# Altium footprint library RDM_ALT_PCB.PcbLib: 129 footprints (part 6 of 9)
Each footprint in its own frame and in the unit in brackets; x right, y up, seen from the top. Pads: shape width x height; smd on the part's side, far side on the other; paste and mask are expansions set on the pad; w line width, h text height; cw(c..) or ccw(c..) is an arc to the next point about the centre after c.
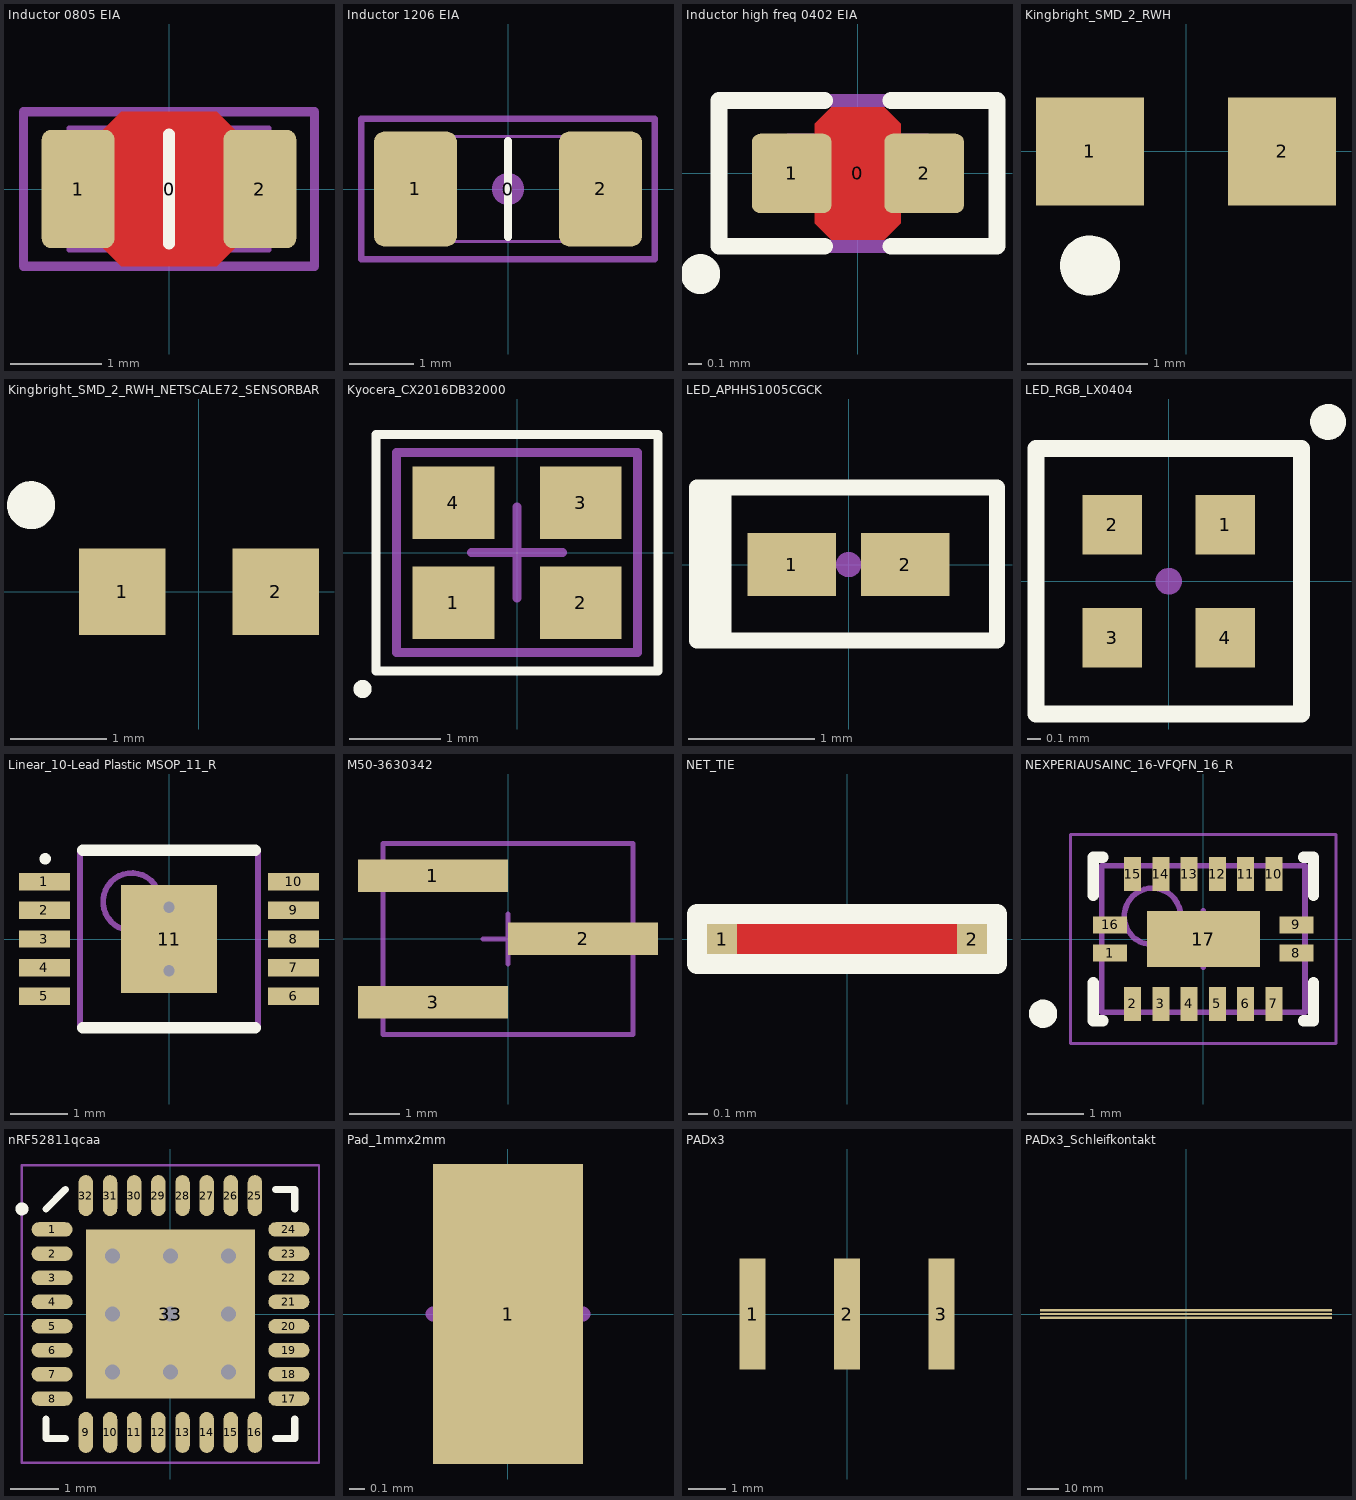
[diagram p5: the footprints below, top view; thin cyan lines are the x and y axes]

## Inductor 0805 EIA [mm]
pads (3):
  round 0.254 on Mech15: 0(0,0)
  rrect25% 0.8x1.3 smd: 1(-1,0) 2(1,0)
Top Layer:
  pour cut-out: -0.725,0.65 -0.525,0.85 0.525,0.85 0.725,0.65 0.725,-0.65 0.525,-0.85 -0.525,-0.85 -0.725,-0.65
Top Overlay:
  lines w0.127: 0,-0.6 0,0.6
Mechanical 13:
  lines w0.05: 0.6,-0.674 -0.6,-0.674 ; -0.6,-0.675 -0.6,0.675 -1.1,0.675 -1.1,-0.675 -0.6,-0.675 ; -0.6,-0.674 0.6,-0.674 ; 0.6,-0.675 0.6,0.675 ; 0.6,-0.675 1.1,-0.675 1.1,0.675 0.6,0.675 ; 0.6,0.674 -0.6,0.674 0.6,0.674
Mechanical 15:
  lines w0.1: -1.6,-0.85 1.6,-0.85 1.6,0.85 -1.6,0.85 -1.6,-0.85
3D body "RES 0805 (2012 metric).STEP": height 0.69, standoff -0.01, extent -1.1,-0.675 1.1,0.675

## Inductor 1206 EIA [mm]
pads (3):
  round 0.508 on Mech15: 0(0,0)
  rrect25% 1.3x1.8 smd: 1(-1.45,0) 2(1.45,0)
Top Overlay:
  lines w0.127: 0,-0.75 0,0.75
Mechanical 13:
  lines w0.05: 1.025,-0.824 -1.025,-0.824 1.025,-0.824 ; -1.625,-0.825 -1.025,-0.825 -1.025,0.825 -1.625,0.825 -1.625,-0.825 ; -1.025,0.824 1.025,0.824 -1.025,0.824 ; 1.025,-0.825 1.025,0.825 1.625,0.825 1.625,-0.825 1.025,-0.825
Mechanical 15:
  lines w0.1: -2.3,-1.1 -2.3,1.1 2.3,1.1 2.3,-1.1 -2.3,-1.1
3D body "RES 1206 (3216 metric).STEP": height 0.69, standoff -0.01, extent -1.625,-0.825 1.625,0.825

## Inductor high freq 0402 EIA [mm]
pads (3):
  round 0.2 on Mech15: 0(0,0)
  rrect20% 0.6x0.6 smd: 1(-0.5,0) 2(0.5,0)
Top Layer:
  pour cut-out: -0.325,0.375 -0.2,0.5 0.2,0.5 0.325,0.375 0.325,-0.375 0.2,-0.5 -0.2,-0.5 -0.325,-0.375
Top Overlay:
  circle w0.25: c-1.19,-0.76 r0.025
  lines w0.127: -0.25,-0.55 -1.05,-0.55 -1.05,0.55 -0.25,0.55 ; 0.25,-0.55 1.05,-0.55 1.05,0.55 0.25,0.55
Mechanical 13:
  lines w0.05: 0.225,-0.274 -0.225,-0.274 0.225,-0.274 ; -0.525,-0.275 -0.525,0.275 -0.225,0.275 -0.225,-0.275 -0.525,-0.275 ; -0.225,0.274 0.225,0.274 -0.225,0.274 ; 0.225,-0.275 0.525,-0.275 0.525,0.275 0.225,0.275 0.225,-0.275
Mechanical 15:
  lines w0.1: -1.05,-0.55 -1.05,0.55 1.05,0.55 1.05,-0.55 -1.05,-0.55
3D body "RES 0402 (1005 metric).STEP": height 0.4, standoff 0, extent -0.525,-0.275 0.525,0.275

## Kingbright_SMD_2_RWH [mm] "Kingbright_SMD_2_RWH"
height 0.6
pads (2):
  rect 0.9x0.9 smd: 1(-0.8,0) 2(0.8,0)
Top Overlay:
  circle w0.25: c-0.8,-0.95 r0.125
3D body "APA1606.STEP": height 0.6, standoff 0, extent -0.801,-0.301 0.8,0.9

## Kingbright_SMD_2_RWH_NETSCALE72_SENSORBAR [mm] "Kingbright_SMD_2_RWH"
height 0.6
pads (2):
  rect 0.9x0.9 smd: 1(-0.8,0) 2(0.8,0)
Top Overlay:
  circle w0.25: c-1.75,0.9 r0.125
3D body "APA1606.STEP": height 0.6, standoff 0, extent -0.801,-0.301 0.8,0.9

## Kyocera_CX2016DB32000 [mm] "CRYSTAL 32.0000MHZ 8PF SMD"
pads (4):
  rect 0.9x0.8 smd: 1(-0.7,-0.55) 2(0.7,-0.55) 3(0.7,0.55) 4(-0.7,0.55)
Top Overlay:
  circle w0.1: c-1.7,-1.5 r0.05
  lines w0.1: -1.55,-1.3 1.55,-1.3 1.55,1.3 -1.55,1.3 -1.55,-1.3
Mechanical 13:
  lines w0.1: -1.325,-1.1 1.325,-1.1 1.325,1.1 -1.325,1.1 -1.325,-1.1
Mechanical 15:
  lines w0.05: -1.55,-1.3 1.55,-1.3 1.55,1.3 -1.55,1.3 -1.55,-1.3
  lines w0.1: -0.5,0 0.5,0 ; 0,-0.5 0,0.5
3D body: height 0.01, standoff -0.05, extent -1.05,-0.85 -0.475,-0.325
3D body: height 0.01, standoff -0.05, extent 0.475,-0.85 1.05,-0.317
3D body: height 0.01, standoff -0.05, extent 0.475,0.325 1.05,0.85
3D body: height 0.01, standoff -0.05, extent -1.05,0.325 -0.475,0.85
3D body: height 0.45, standoff 0, extent -1.15,-0.95 1.15,0.95
3D body: height 0.6, standoff -0.6, extent 0.375,-1.4 0.375,-1.4

## LED_APHHS1005CGCK [mm] "LED_CHIP_0402"
height 0.6
pads (2):
  rect 0.7x0.5 smd: 1(-0.45,0) 2(0.45,0)
Top Overlay:
  rectangle: -1.2,-0.6 -0.925,0.6
  lines w0.127: -1.2,-0.6 -1.2,0.61 1.175,0.61 1.175,-0.6 -1.2,-0.6
Mechanical 15:
  circle w0.1: c0,0 r0.05
  lines w0.1: -1.125,-0.6 -1.125,0.6 1.175,0.6 1.175,-0.6 -1.125,-0.6
3D body "User Library-LED_1006_G.STEP": height 0.2, standoff 0, extent -0.5,-0.3 0.5,0.3

## LED_RGB_LX0404 [mm] "LED RGB CLEAR SMD"
height 0.25
pads (4):
  rect 0.45x0.45 smd: 1(0.425,0.425) 2(-0.425,0.425) 3(-0.425,-0.425) 4(0.425,-0.425)
Top Overlay:
  circle w0.15: c1.2,1.2 r0.06
  lines w0.127: -1,-1 1,-1 1,1 -1,1 -1,-1
Mechanical 15:
  circle w0.1: c0,0 r0.05
  lines w0.1: -1,-1 -1,1 1,1 1,-1 -1,-1
3D body: height 0.26, standoff 0, extent -0.128,-0.333 0.128,0.333
3D body: height 0.25, standoff 0, extent -0.8,-0.8 0.8,0.8
3D body: height 0.26, standoff 0, extent 0.297,-0.333 0.553,0.333
3D body: height 0.26, standoff 0, extent -0.553,-0.333 -0.297,0.333

## Linear_10-Lead Plastic MSOP_11_R [mm] "Linear_10-Lead Plastic MSOP_11_R"
height 1.1
pads (11):
  rect 0.889x0.305 smd mask+0.082: 1(-2.171,1) 2(-2.171,0.5) 3(-2.171,0) 4(-2.171,-0.5) 5(-2.171,-1) 6(2.171,-1) 7(2.171,-0.5) 8(2.171,0) 9(2.171,0.5) 10(2.171,1)
  rect 1.68x1.88 smd mask+0.082: 11(0,0)
via 0,-0.55 diameter 0.5 hole 0.2
via 0,0.55 diameter 0.5 hole 0.2
Top Overlay:
  circle w0.2: c-2.159,1.397 r0
  lines w0.2: -1.5,-1.55 1.5,-1.55 ; -1.5,1.55 1.5,1.55
Mechanical 13:
  circle w0.1: c-0.65,0.65 r0.5
  lines w0.1: -1.55,-1.55 1.55,-1.55 1.55,1.55 -1.55,1.55 -1.55,-1.55
3D body: height 1.1, standoff 0.05, extent -1.55,-1.55 1.55,1.55

## M50-3630342 [mm] "M50-3630342"
height 4.5
pads (3):
  rect 3x0.65 smd: 1(-1.5,1.27) 2(1.5,0) 3(-1.5,-1.27)
Mechanical 13:
  lines w0.1: -2.5,-1.906 -2.5,1.906 2.5,1.906 2.5,-1.906 -2.5,-1.906
Mechanical 15:
  lines w0.1: -0.5,0 0.5,0 ; 0,-0.5 0,0.5
3D body "M50-3630342.STEP": height 4.5, standoff 0, extent -2.5,-1.906 2.5,1.906

## NET_TIE [mil] "Allows to short two different types of nets"
pads (2):
  rect 6x6 smd: 1(-25,0) 2(25,0)
Top Layer:
  lines w6: -25,0 25,0
Top Overlay:
  lines w4: -30,-5 -30,5 30,5 30,-5 -30,-5

## NEXPERIAUSAINC_16-VFQFN_16_R [mm]
pads (17):
  rect 0.6x0.3 smd paste-0.05 mask+0.08: 1(-1.65,-0.25) 8(1.65,-0.25) 9(1.65,0.25) 16(-1.65,0.25)
  rect 0.3x0.6 smd paste-0.05 mask+0.08: 2(-1.25,-1.15) 3(-0.75,-1.15) 4(-0.25,-1.15) 5(0.25,-1.15) 6(0.75,-1.15) 7(1.25,-1.15) 10(1.25,1.15) 11(0.75,1.15) 12(0.25,1.15) 13(-0.25,1.15) 14(-0.75,1.15) 15(-1.25,1.15)
  rect 2x1 smd: 17(0,0)
Top Overlay:
  circle w0.25: c-2.838,-1.324 r0.125
  lines w0.2: -1.95,-0.775 -1.95,-1.45 -1.775,-1.45 ; -1.95,0.775 -1.95,1.45 -1.775,1.45 ; 1.775,-1.45 1.95,-1.45 1.95,-0.775 ; 1.775,1.45 1.95,1.45 1.95,0.775
Mechanical 13:
  circle w0.1: c-0.9,0.4 r0.5
  lines w0.1: -1.8,-1.3 -1.8,1.3 1.8,1.3 1.8,-1.3 -1.8,-1.3
Mechanical 15:
  lines w0.05: -2.35,-1.85 -2.35,1.85 2.35,1.85 2.35,-1.85 -2.35,-1.85
  lines w0.1: -0.5,0 0.5,0 ; 0,-0.5 0,0.5
3D body "QFN50P350X250X100_HS-17N.step": height 1, standoff 0, extent -1.85,-1.35 1.85,1.35

## nRF52811qcaa [mm] "Nordic QFN 32"
pads (33):
  oval 0.85x0.3 smd mask+0.076: 1(-2.45,1.75) 2(-2.45,1.25) 3(-2.45,0.75) 4(-2.45,0.25) 5(-2.45,-0.25) 6(-2.45,-0.75) 7(-2.45,-1.25) 8(-2.45,-1.75) 17(2.45,-1.75) 18(2.45,-1.25) 19(2.45,-0.75) 20(2.45,-0.25) 21(2.45,0.25) 22(2.45,0.75) 23(2.45,1.25) 24(2.45,1.75)
  oval 0.3x0.85 smd mask+0.076: 9(-1.75,-2.45) 10(-1.25,-2.45) 11(-0.75,-2.45) 12(-0.25,-2.45) 13(0.25,-2.45) 14(0.75,-2.45) 15(1.25,-2.45) 16(1.75,-2.45) 25(1.75,2.45) 26(1.25,2.45) 27(0.75,2.45) 28(0.25,2.45) 29(-0.25,2.45) 30(-0.75,2.45) 31(-1.25,2.45) 32(-1.75,2.45)
  rect 3.5x3.5 smd: 33(0,0)
via 0,0 diameter 0.61 hole 0.305
via 0,1.2 diameter 0.61 hole 0.305
via -1.2,1.2 diameter 0.61 hole 0.305
via -1.2,0 diameter 0.61 hole 0.305
via -1.2,-1.2 diameter 0.61 hole 0.305
via 0,-1.2 diameter 0.61 hole 0.305
via 1.2,-1.2 diameter 0.61 hole 0.305
via 1.2,0 diameter 0.61 hole 0.305
via 1.2,1.2 diameter 0.61 hole 0.305
Top Overlay:
  circle w0.15: c-3.075,2.175 r0.06
  lines w0.15: -2.575,-2.175 -2.575,-2.575 -2.175,-2.575 ; -2.575,2.175 -2.175,2.575 ; 2.175,-2.575 2.575,-2.575 2.575,-2.175 ; 2.175,2.575 2.575,2.575 2.575,2.175
Mechanical 15:
  lines w0.05: -3.075,-3.075 3.075,-3.075 3.075,3.075 -3.075,3.075 -3.075,-3.075
  lines w0.1: -0.5,0 0.5,0 ; 0,-0.5 0,0.5
3D body "QFN50P500X500X90_HS-33N.step": height 0.9, standoff 0, extent -2.501,-2.501 2.501,2.501

## Pad_1mmx2mm [mm] "Pad_1mmx2mm"
pads (1):
  rect 1x2 smd paste-1: 1(0,0)
Mechanical 15:
  lines w0.1: -0.5,0 0.5,0 ; 0,-0.5 0,0.5

## PADx3 [mm] "3 PADS"
pads (3):
  rect 0.7x3 smd: 1(-2.54,0) 2(0,0) 3(2.54,0)

## PADx3_Schleifkontakt [mm] "3 PADS"
pads (3):
  rect 93.8x0.8 smd: 1(0,1.27) 2(0,0) 3(0,-1.27)